# Altium footprint library c3_PcbLib.PcbLib: 222 footprints (part 5 of 14)
Each footprint in its own frame and in the unit in brackets; x right, y up, seen from the top. Pads: shape width x height; smd on the part's side, far side on the other; paste and mask are expansions set on the pad; w line width, h text height; cw(c..) or ccw(c..) is an arc to the next point about the centre after c.
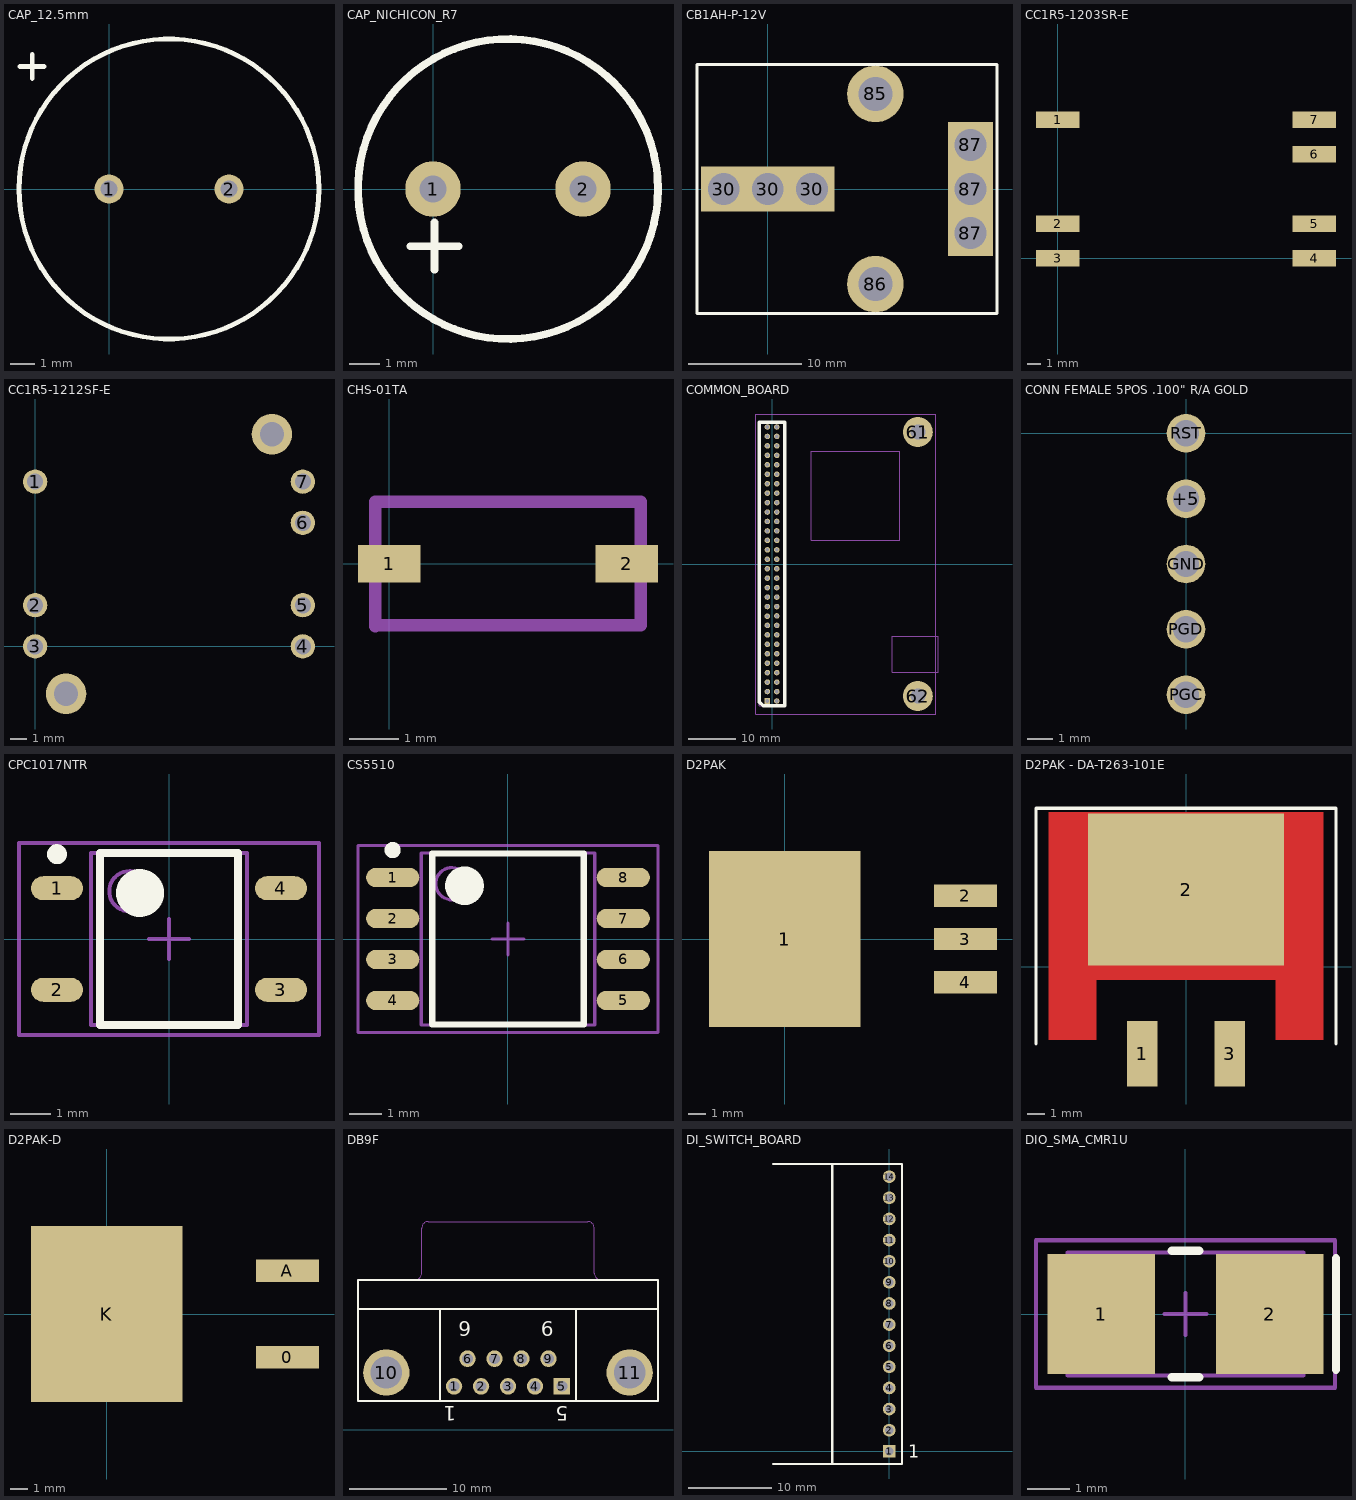
[diagram p4: the footprints below, top view; thin cyan lines are the x and y axes]

## CAP_12.5mm [mm]
pads (2):
  round 1.2 hole 0.7: 1(0,0) 2(5,0)
Top Overlay:
  circle w0.2: c2.5,0 r6.25
  lines w0.2: -3.718,5.1 -2.702,5.1 ; -3.2,4.6 -3.2,5.616

## CAP_NICHICON_R7 [mm]
pads (2):
  round 1.85 hole 0.9: 1(0,0) 2(5,0)
Top Overlay:
  circle w0.254: c2.5,0 r5
  lines w0.254: -0.762,-1.905 0.864,-1.905 ; 0.051,-2.692 0.051,-1.118
3D body: height 12.5, standoff 0, extent -2.464,-4.953 7.544,5.055

## CB1AH-P-12V [mm] "RELAY AUTO SPST 12VDC 70A PCB"
pads (8):
  rect 4x4 hole 2.81: 30(-3.9,0) 30(0,0) 30(3.9,0) 87(17.9,-3.9) 87(17.9,0) 87(17.9,3.9)
  round 5 hole 3: 85(9.5,8.4) 86(9.5,-8.4)
Top Overlay:
  lines w0.254: -6.258,-11 20.242,-11 20.242,11 -6.258,11 -6.258,-11

## CC1R5-1203SR-E [mm]
pads (7):
  rect 3.2x1.2 smd: 1(0,10.16) 2(0,2.54) 3(0,0) 4(18.8,0) 5(18.8,2.54) 6(18.8,7.62) 7(18.8,10.16)

## CC1R5-1212SF-E [mm]
height 34
pads (9):
  round 1.5 hole 1: 1(0,10.16) 2(0,2.54) 3(0,0) 4(16.51,0) 5(16.51,2.54) 6(16.51,7.62) 7(16.51,10.16)
  round 2.5 hole 1.5: ""(1.905,-2.92) ""(14.605,13.08)

## CHS-01TA [mil]
pads (2):
  rect 50x30 smd: 1(0,0) 2(190,0)
Mechanical 13:
  lines w10: -11.3,-50 -10.51,-49.21 201.3,-49.21 201.3,49.21 -11.3,49.21 -11.3,-50
3D body: height 98.43, standoff 0, extent -11.32,-50.02 201.32,49.23

## COMMON_BOARD [mil]
pads (62):
  rect 46x46 hole 31: 1(-38.74,-1141.73)
  round 46 hole 31: 2(40,-1141.73) 3(-38.74,-1062.99) 4(40,-1062.99) 5(-38.74,-984.25) 6(40,-984.25) 7(-38.74,-905.51) 8(40,-905.51) 9(-38.74,-826.77) 10(40,-826.77) 11(-38.74,-748.03) 12(40,-748.03) 13(-38.74,-669.29) 14(40,-669.29) 15(-38.74,-590.55) 16(40,-590.55) 17(-38.74,-511.81) 18(40,-511.81) 19(-39.37,-435) 20(40,-433.07) 21(-38.74,-354.33) 22(40,-354.33) 23(-38.74,-275.59) 24(40,-275.59) 25(-38.74,-196.85) 26(40,-196.85) 27(-38.74,-118.11) 28(40,-118.11) 29(-38.74,-39.37) 30(40,-39.37) 31(-38.74,39.37) 32(40,39.37) 33(-38.74,118.11) 34(40,118.11) 35(-38.74,196.85) 36(40,196.85) 37(-38.74,275.59) 38(40,275.59) 39(-38.74,354.33) 40(40,354.33) 41(-38.74,433.07) 42(40,433.07) 43(-38.74,511.81) 44(40,511.81) 45(-38.74,590.55) 46(40,590.55) 47(-38.74,669.29) 48(40,669.29) 49(-38.74,748.03) 50(40,748.03) 51(-38.74,826.77) 52(40,826.77) 53(-38.74,905.51) 54(40,905.51) 55(-38.74,984.25) 56(40,984.25) 57(-38.74,1062.99) 58(40,1062.99) 59(-38.74,1141.73) 60(40,1141.73)
  round 250 hole 125: 61(1215,1100) 62(1215,-1100)
Top Overlay:
  lines w29.53: -105,-1150 -105,1181.1 105,1181.1 105,-1181.1 -73.9,-1181.1 -105,-1150
Mechanical 13:
  circle w10: c1215,-1100 r100
  circle w10: c1215,1100 r100
  lines w10: -135,-1250 -135,1250 1365,1250 1365,-1250 -135,-1250 ; -105,-1181.1 105,-1181.1 105,1181.1 -105,1181.1 -105,-1181.1 ; 325,200 325,940 1065,940 1065,200 325,200 ; 1000,-900 1000,-600 1385,-600 1385,-900 1000,-900
3D body: height 375, standoff 0, extent 1114.54,-1200.46 1315.46,-999.54
3D body: height 375, standoff 0, extent 1114.54,999.54 1315.46,1200.46
3D body: height 856.5, standoff 0.1, extent -135,-1250 1384.98,1250

## CONN FEMALE 5POS .100" R/A GOLD [mm] "PICKIT2 Programmer Header"
height 8.5
pads (5):
  round 1.5 hole 1.02: +5(0,-2.54) GND(0,-5.08) PGC(0,-10.16) PGD(0,-7.62) RST(0,0)
3D body: height 2.54, standoff 0, extent 1.6,-11.7 10.1,1.5

## CPC1017NTR [mm] "SOP, 4-Leads, Body 4.3x3.9mm (max), Pitch 2.54mm, IPC Medium Density"
height 2.184
pads (4):
  oval 1.3x0.6 smd: 1(-2.8,1.27) 2(-2.8,-1.27) 3(2.8,-1.27) 4(2.8,1.27)
Top Overlay:
  circle w0.6: c-0.725,1.15 r0.3
  circle w0.25: c-2.8,2.12 r0.125
  lines w0.2: -1.725,-2.15 1.725,-2.15 1.725,2.15 -1.725,2.15 -1.725,-2.15
Mechanical 13:
  circle w0.1: c-0.995,1.195 r0.5
  lines w0.1: -1.945,-2.145 1.945,-2.145 1.945,2.145 -1.945,2.145 -1.945,-2.145
Mechanical 15:
  lines w0.1: -0.5,0 0.5,0 ; 0,-0.5 0,0.5 ; -3.75,-2.4 3.75,-2.4 3.75,2.4 -3.75,2.4 -3.75,-2.4
3D body: height 2.18, standoff 0.03, extent -1.945,-2.145 1.945,2.145

## CS5510 [mm]
height 2.13
pads (8):
  oval 1.65x0.6 smd: 1(-3.575,1.905) 2(-3.575,0.635) 3(-3.575,-0.635) 4(-3.575,-1.905) 5(3.575,-1.905) 6(3.575,-0.635) 7(3.575,0.635) 8(3.575,1.905)
Top Overlay:
  circle w0.6: c-1.35,1.65 r0.3
  circle w0.25: c-3.575,2.755 r0.125
  lines w0.2: -2.35,-2.65 2.35,-2.65 2.35,2.65 -2.35,2.65 -2.35,-2.65
Mechanical 13:
  circle w0.1: c-1.74,1.715 r0.5
  lines w0.1: -2.69,-2.665 2.69,-2.665 2.69,2.665 -2.69,2.665 -2.69,-2.665
Mechanical 15:
  lines w0.1: -0.5,0 0.5,0 ; 0,-0.5 0,0.5 ; -4.65,-2.9 4.65,-2.9 4.65,2.9 -4.65,2.9 -4.65,-2.9
3D body: height 2.13, standoff 0.1, extent -2.69,-2.665 2.69,2.665

## D2PAK [mm]
pads (4):
  rect 8.9x10.3 smd: 1(0,0)
  rect 3.7x1.3 smd: 2(10.6,2.54) 3(10.6,0) 4(10.6,-2.54)

## D2PAK - DA-T263-101E [mil] "D2-PAK/TO-263-AB; 3 Leads (1 Cropped); Body 15.5 (inc. leads) x 10.5 mm (LxW max)"
height 184.65
pads (3):
  rect 70x150 smd: 1(-100,-200) 3(100,-200)
  rect 450x350 smd: 2(0,177.17)
Top Layer:
  region: -314.96,354.33 -314.96,-167.32 -206.69,-167.32 -206.69,-29.53 206.69,-29.53 206.69,-167.32 314.96,-167.32 314.96,354.33
Top Overlay:
  lines w7.87: -344.49,-177.17 -344.49,364.17 344.49,364.17 344.49,-177.17
Top Solder:
  region: -316.93,356.3 -316.93,-169.29 -204.72,-169.29 -204.72,-31.5 204.72,-31.5 204.72,-169.29 316.93,-169.29 316.93,356.3
3D body: height 400, standoff 0, extent -510,-147.64 510,352.36
3D body: height 192.32, standoff -5.24, extent -200,-255.91 200,345.03

## D2PAK-D [mm]
pads (3):
  rect 3.7x1.3 smd: 0(10.6,-2.54) A(10.6,2.54)
  rect 8.9x10.3 smd: K(0,0)

## DB9F [mm]
pads (11):
  round 1.69 hole 1.09: 1(-24.244,4.449) 2(-21.474,4.449) 3(-18.704,4.449) 4(-15.934,4.449) 6(-22.859,7.289) 7(-20.089,7.289) 8(-17.319,7.289) 9(-14.549,7.289)
  rect 1.69x1.69 hole 1.09: 5(-13.164,4.449)
  round 4.76 hole 3.26: 10(-31.199,5.869) 11(-6.209,5.869)
Top Overlay:
  lines w0.2: -34.104,12.369 -3.304,12.369 ; -25.704,2.969 -25.704,12.369 ; -11.704,2.969 -11.704,12.369 ; -34.104,2.969 -3.304,2.969 -3.304,15.369 -34.104,15.369 -34.104,2.969
  text "6" at -22.454,11.125 h1.5
  text "1" at -24.003,2.413 h1.5
  text "5" at -12.497,2.388 h1.5
  text "9" at -14.021,11.151 h1.5
Mechanical 13:
  lines w0.1: -34.104,12.369 -3.304,12.369 ; -28.264,15.374 ccw(c-28.264,16.069) -27.569,16.069 ; -27.584,16.027 -27.584,20.701 ; -27.564,20.674 cw(c-26.869,20.674) -26.869,21.369 -10.539,21.369 cw(c-10.539,20.674) -9.844,20.674 ; -25.704,2.969 -25.704,12.369 ; -11.704,2.969 -11.704,12.369 ; -9.839,16.069 ccw(c-9.144,16.069) -9.144,15.374 ; -9.83,16.078 -9.83,20.65 ; -34.104,2.969 -34.104,15.369 -3.304,15.369 -3.304,2.969 -34.104,2.969
3D body: height 12.75, standoff -3.85, extent -34.12,2.916 -3.32,21.336

## DI_SWITCH_BOARD [mil]
pads (14):
  rect 60x60 hole 39: 1(0,0)
  round 60 hole 39: 2(0,100) 3(0,200) 4(0,300) 5(0,400) 6(0,500) 7(0,600) 8(0,700) 9(0,800) 10(0,900) 11(0,1000) 12(0,1100) 13(0,1200) 14(0,1300)
Top Overlay:
  lines w10: -550,-60 -270,-60 ; -550,1360 -270,1360 ; -270,-60 -270,1360 ; -270,-60 60,-60 60,1360 -270,1360
  text "1" at 90,-30 h60
3D body: height 272.5, standoff -230, extent -260,-50 50,1350
3D body: height 1185, standoff 0, extent -1376.02,-1849.99 -57,3150.01

## DIO_SMA_CMR1U [mm] "Molded Diode, 2-Leads, Body 5.2x2.6mm, IPC Medium Density"
height 2.62
pads (2):
  rect 2.55x2.85 smd: 1(-2,0) 2(2,0)
Top Overlay:
  lines w0.2: -0.325,-1.5 0.325,-1.5 ; -0.325,1.5 0.325,1.5 ; 3.575,-1.325 3.575,1.325
Mechanical 13:
  rectangle: 2.043,-1.46 2.795,1.46
  lines w0.1: -2.795,-1.46 -2.795,1.46 2.795,1.46 2.795,-1.46 -2.795,-1.46
Mechanical 15:
  lines w0.1: -0.5,0 0.5,0 ; 0,-0.5 0,0.5 ; -3.55,-1.75 -3.55,1.75 3.55,1.75 3.55,-1.75 -3.55,-1.75
3D body: height 2.62, standoff 0, extent -2.795,-1.46 2.795,1.46